# Altium footprint library PCB_Lib_Devzone.PcbLib: 491 footprints (part 15 of 31)
Each footprint in its own frame and in the unit in brackets; x right, y up, seen from the top. Pads: shape width x height; smd on the part's side, far side on the other; paste and mask are expansions set on the pad; w line width, h text height; cw(c..) or ccw(c..) is an arc to the next point about the centre after c.
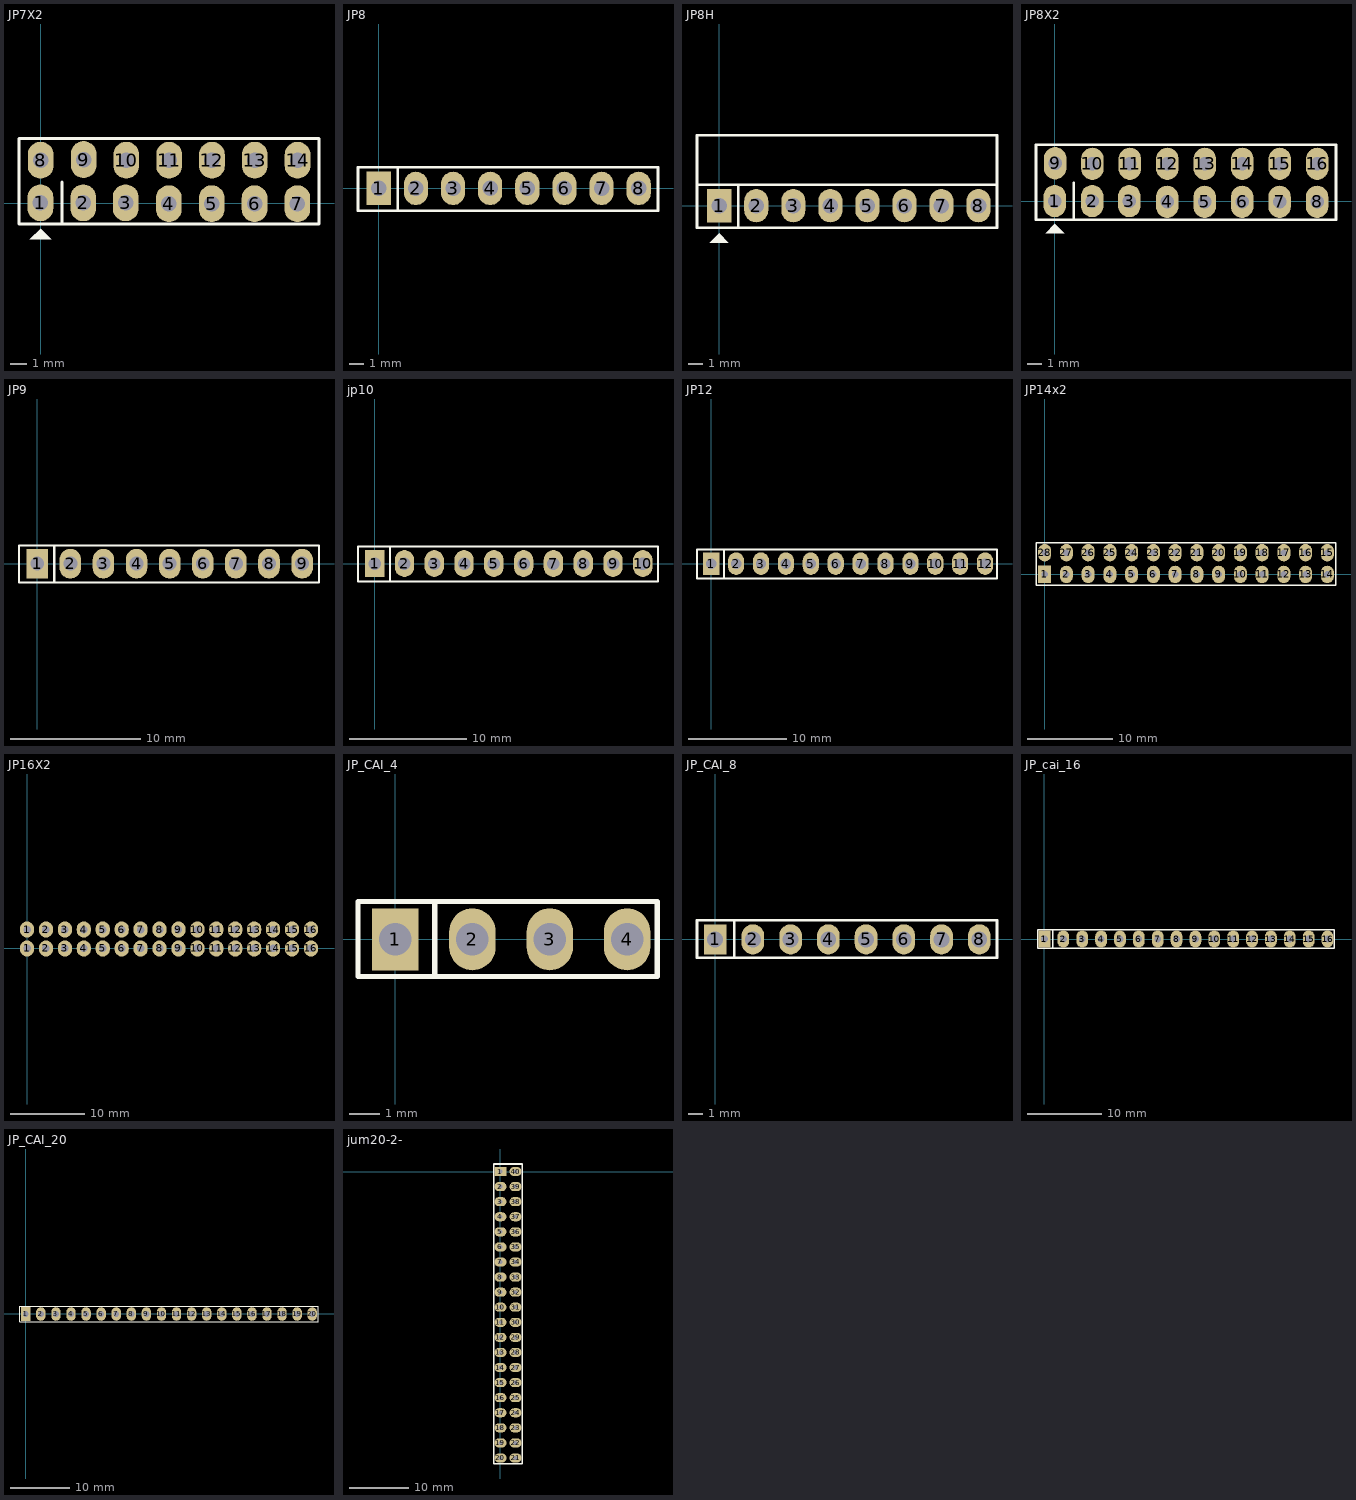
[diagram p14: the footprints below, top view; thin cyan lines are the x and y axes]

## JP7X2 [mil]
pads (14):
  oval 60x86 hole 36: 1(-0.5,0.5) 2(99.5,0.5) 3(198.5,0.5) 4(299.5,-1.5) 5(399.5,-1.5) 6(499.5,-1.5) 7(599.5,-1.5) 8(0,100) 9(100.5,101.5) 10(200,100) 11(300,100) 12(400,100) 13(500,100) 14(600,100)
Top Overlay:
  region: 0,-60 -25,-85 25,-85
  lines w7: 50,-49 50,49 ; -50.5,-49.5 650,-49.5 650,150.5 -50.5,150.5 -50.5,50.5 -50.5,-49.5
3D body "JP7X2.stp": height 335.25, standoff -117.51, extent -49.99,-49.99 650.01,150.01

## JP8 [mil] "JP8"
height 200
pads (8):
  rect 65x90 hole 42: 1(0,0)
  oval 65x90 hole 42: 2(100,0) 3(200,0) 4(300,0) 5(400,0) 6(500,0) 7(600,0) 8(700,0)
Top Overlay:
  lines w7: 51,-60 51,56 ; -56,-60 752,-60 752,57 -56,57 -56,-60
3D body "JP1-8.stp": height 323.43, standoff -117.51, extent -48.03,-50 748.03,48.43

## JP8H [mil]
pads (8):
  rect 65x90 hole 42: 1(0,0)
  oval 65x90 hole 42: 2(100,0) 3(200,0) 4(300,0) 5(400,0) 6(500,0) 7(600,0) 8(700,0)
Top Overlay:
  region: 0,-75 -25,-100 25,-100
  lines w7: 51,-60 51,56 ; -60,57 -60,190 750,190 750,57 ; -60,57 750,57 ; -60,57 -60,-60 750,-60 750,57
3D body "JP8H.stp": height 49.21, standoff -143.7, extent -46.06,-14.96 746.06,423.62

## JP8X2 [mil]
pads (16):
  oval 60x86 hole 36: 1(-0.5,0.5) 2(99.5,0.5) 3(198.5,0.5) 4(299.5,-1.5) 5(399.5,-1.5) 6(499.5,-1.5) 7(599.5,-1.5) 8(699.5,-1.5) 9(0.5,101.5) 10(100,100) 11(200,100) 12(300,100) 13(400,100) 14(500,100) 15(600,100) 16(700,100)
Top Overlay:
  region: 0,-60 -25,-85 25,-85
  lines w7: 50,-49 50,49 ; -50.5,-49.5 -50.5,50.5 -50.5,150.5 750,150.5 750,-49.5 -50.5,-49.5
3D body "JP8X2.stp": height 335.25, standoff -117.51, extent -49.99,-49.99 750.01,150.01

## JP9 [mil]
pads (9):
  rect 65x90 hole 42: 1(0,0)
  oval 65x90 hole 42: 2(100,0) 3(200,0) 4(300,0) 5(400,0) 6(500,0) 7(600,0) 8(700,0) 9(800,0)
Top Overlay:
  lines w7: 51,-57 51,55 ; -55,-57 851,-57 851,55 -55,55 -55,-57
3D body "JP1-7.stp": height 323.44, standoff -117.51, extent -47.99,-50.2 648.07,48.22
3D body "JP2.stp": height 323.44, standoff -117.51, extent 649.01,-50.21 845.07,48.22

## jp10 [mil]
pads (10):
  rect 65x90 hole 42: 1(0,0)
  oval 65x90 hole 42: 2(100,0) 3(200,0) 4(300,0) 5(400,0) 6(500,0) 7(600,0) 8(700,0) 9(800,0) 10(900,0)
Top Overlay:
  lines w7: 51,-60 51,56 ; -56,-60 -56,57 951,57 951,-60 -56,-60
3D body "JP1-8.stp": height 323.43, standoff -117.51, extent -48,-50.21 748.06,48.21
3D body "JP2.stp": height 323.44, standoff -117.51, extent 748.06,-50.21 944.13,48.21

## JP12 [mil]
pads (12):
  rect 65x90 hole 42: 1(0,0)
  oval 65x90 hole 42: 2(100,0) 3(200,0) 4(300,0) 5(400,0) 6(500,0) 7(600,0) 8(700,0) 9(800,0) 10(900,0) 11(1000,0) 12(1100,0)
Top Overlay:
  lines w7: 51,-60 51,56 ; -57,-60 1148,-60 1148,57 -57,57 -57,-60
3D body "JP2.stp": height 323.44, standoff -117.51, extent 748.06,-50.21 944.13,48.21
3D body "JP1-8.stp": height 323.43, standoff -117.51, extent -48,-50.21 748.06,48.21
3D body "JP2.stp": height 323.44, standoff -117.51, extent 944,-50.21 1140.07,48.22

## JP14x2 [mil]
pads (28):
  rect 60x80 hole 30: 1(0,0)
  oval 60x80 hole 30: 2(100,0) 3(200,0) 4(300,0) 5(400,0) 6(500,0) 7(600,0) 8(700,0) 9(800,0) 10(900,0) 11(1000,0) 12(1100,0) 13(1200,0) 14(1300,0) 15(1300,100) 16(1200,100) 17(1100,100) 18(1000,100) 19(900,100) 20(800,100) 21(700,100) 22(600,100) 23(500,100) 24(400,100) 25(300,100) 26(200,100) 27(100,100) 28(0,100)
Top Overlay:
  lines w7: -38,-49 -38,145 1338,145 1338,-49 -38,-49
3D body "pin_header_aw140-eg-g14d.stp": height 322.83, standoff -118.11, extent -53,-51.36 1347,47
3D body "pin_header_aw140-eg-g14d.stp": height 322.83, standoff -118.11, extent -53,47 1347,145.36
3D body "jumper_akspt_g-grey.stp": height -120, standoff -355.04, extent 1251,-51.06 1347.06,145
3D body "jumper_akspt_g-grey.stp": height -120, standoff -355.04, extent 1152,-51.06 1248.06,145
3D body "jumper_akspt_g-grey.stp": height -120, standoff -355.04, extent 1052,-51.06 1148.06,145
3D body "jumper_akspt_g-grey.stp": height -120, standoff -355.04, extent 951.94,-51 1048,145.06
3D body "jumper_akspt_g-grey.stp": height -120, standoff -355.04, extent 851.94,-51 948,145.06
3D body "jumper_akspt_g-grey.stp": height -120, standoff -355.04, extent 751,-51 847.06,145.06
3D body "jumper_akspt_g-grey.stp": height -120, standoff -355.04, extent 647.97,-51 744.03,145.06
3D body "jumper_akspt_g-grey.stp": height -120, standoff -355.04, extent 547,-51.06 643.06,145
3D body "jumper_akspt_g-grey.stp": height -120, standoff -355.04, extent 447,-51.06 543.06,145
3D body "jumper_akspt_g-grey.stp": height -120, standoff -355.04, extent 347,-51.06 443.06,145
3D body "jumper_akspt_g-grey.stp": height -120, standoff -355.04, extent 247,-51.06 343.06,145
3D body "jumper_akspt_g-grey.stp": height -120, standoff -355.04, extent 147,-51.06 243.06,145
3D body "jumper_akspt_g-grey.stp": height -120, standoff -355.04, extent 47,-51.06 143.06,145
3D body "jumper_akspt_g-grey.stp": height -120, standoff -355.04, extent -53,-50.7 43.07,145.36

## JP16X2 [mil]
pads (32):
  oval 75x85 hole 39.37: 1(0,0) 1(0,100) 2(100,0) 2(100,100) 3(200,0) 3(200,100) 4(300,0) 4(300,100) 5(400,0) 5(400,100) 6(500,0) 6(500,100) 7(600,0) 7(600,100) 8(700,0) 8(700,100) 9(800,0) 9(800,100) 10(900,0) 10(900,100) 11(1000,0) 11(1000,100) 12(1100,0) 12(1100,100) 13(1200,0) 13(1200,100) 14(1300,0) 14(1300,100) 15(1400,0) 15(1400,100) 16(1500,0) 16(1500,100)

## JP_CAI_3 [mil]

## JP_CAI_4 [mil]
pads (4):
  rect 60x80 hole 42: 1(0,0)
  oval 60x80 hole 42: 2(100,0) 3(200,0) 4(300,0)
Top Overlay:
  lines w7: 51,-47 51,47 ; -48,-48 339,-48 339,49 -48,49 -48,-48
3D body "female_header_a-bl254-eg-g04d.stp": height 334.65, standoff -125.98, extent -55.91,-47.21 353.93,51.22

## JP_CAI_8 [mil]
pads (8):
  rect 60x80 hole 42: 1(0,0)
  oval 60x80 hole 42: 2(100,0) 3(200,0) 4(300,0) 5(400,0) 6(500,0) 7(600,0) 8(700,0)
Top Overlay:
  lines w7: 51,-47 51,51 ; -48,-49 -48,51 747,51 747,-49 -48,-49
3D body "female_header_a-bl254-eg-g08d.stp": height 334.65, standoff -125.98, extent -54.92,-48.21 754.93,50.22

## JP_cai_16 [mil]
pads (16):
  rect 62x90 hole 36: 1(0,0)
  oval 62x90 hole 36: 2(100,0) 3(200,0) 4(300,0) 5(400,0) 6(500,0) 7(600,0) 8(700,0) 9(800,0) 10(900,0) 11(1000,0) 12(1100,0) 13(1200,0) 14(1300,0) 15(1400,0) 16(1500,0)
Top Overlay:
  lines w7: 45,-50 45,50 ; -37,-50 1535,-50 1535,50 -37,50 -37,-50
3D body "female_header_a-bl254-eg-g16d.stp": height 334.65, standoff -125.98, extent -52.92,-49.98 1556.92,48.44

## JP_CAI_20 [mil]
pads (20):
  rect 62x90 hole 39: 1(0,0)
  oval 62x90 hole 39: 2(100,0) 3(200,0) 4(300,0) 5(400,0) 6(500,0) 7(600,0) 8(700,0) 9(800,0) 10(900,0) 11(1000,0) 12(1100,0) 13(1200,0) 14(1300,0) 15(1400,0) 16(1500,0) 17(1600,0) 18(1700,0) 19(1800,0) 20(1900,0)
Top Overlay:
  lines w7: -39,-53 -39,53 1940,53 1940,-53 -39,-53
3D body "female_header_a-bl254-eg-g20d.stp": height 334.65, standoff -125.98, extent -52.92,-49.21 1956.93,49.22

## jum20-2 [mil]

## jum20-2- [mil]
pads (40):
  rect 80x60 hole 25: 1(0,0)
  oval 80x60 hole 25: 2(0,-100) 3(0,-200) 4(0,-300) 5(0,-400) 6(0,-500) 7(0,-600) 8(0,-700) 9(0,-800) 10(0,-900) 11(0,-1000) 12(0,-1100) 13(0,-1200) 14(0,-1300) 15(0,-1400) 16(0,-1500) 17(0,-1600) 18(0,-1700) 19(0,-1800) 20(0,-1900) 21(100,-1900) 22(100,-1800) 23(100,-1700) 24(100,-1600) 25(100,-1500) 26(100,-1400) 27(100,-1300) 28(100,-1200) 29(100,-1100) 30(100,-1000) 31(100,-900) 32(100,-800) 33(100,-700) 34(100,-600) 35(100,-500) 36(100,-400) 37(100,-300) 38(100,-200) 39(100,-100) 40(100,0)
Top Overlay:
  lines w10: 25,50 145,50 145,-1937 -45,-1937 -45,50 75,50